# Altium footprint library GyokuRe.PcbLib: 1248 footprints (part 12 of 78)
Each footprint in its own frame and in the unit in brackets; x right, y up, seen from the top. Pads: shape width x height; smd on the part's side, far side on the other; paste and mask are expansions set on the pad; w line width, h text height; cw(c..) or ccw(c..) is an arc to the next point about the centre after c.
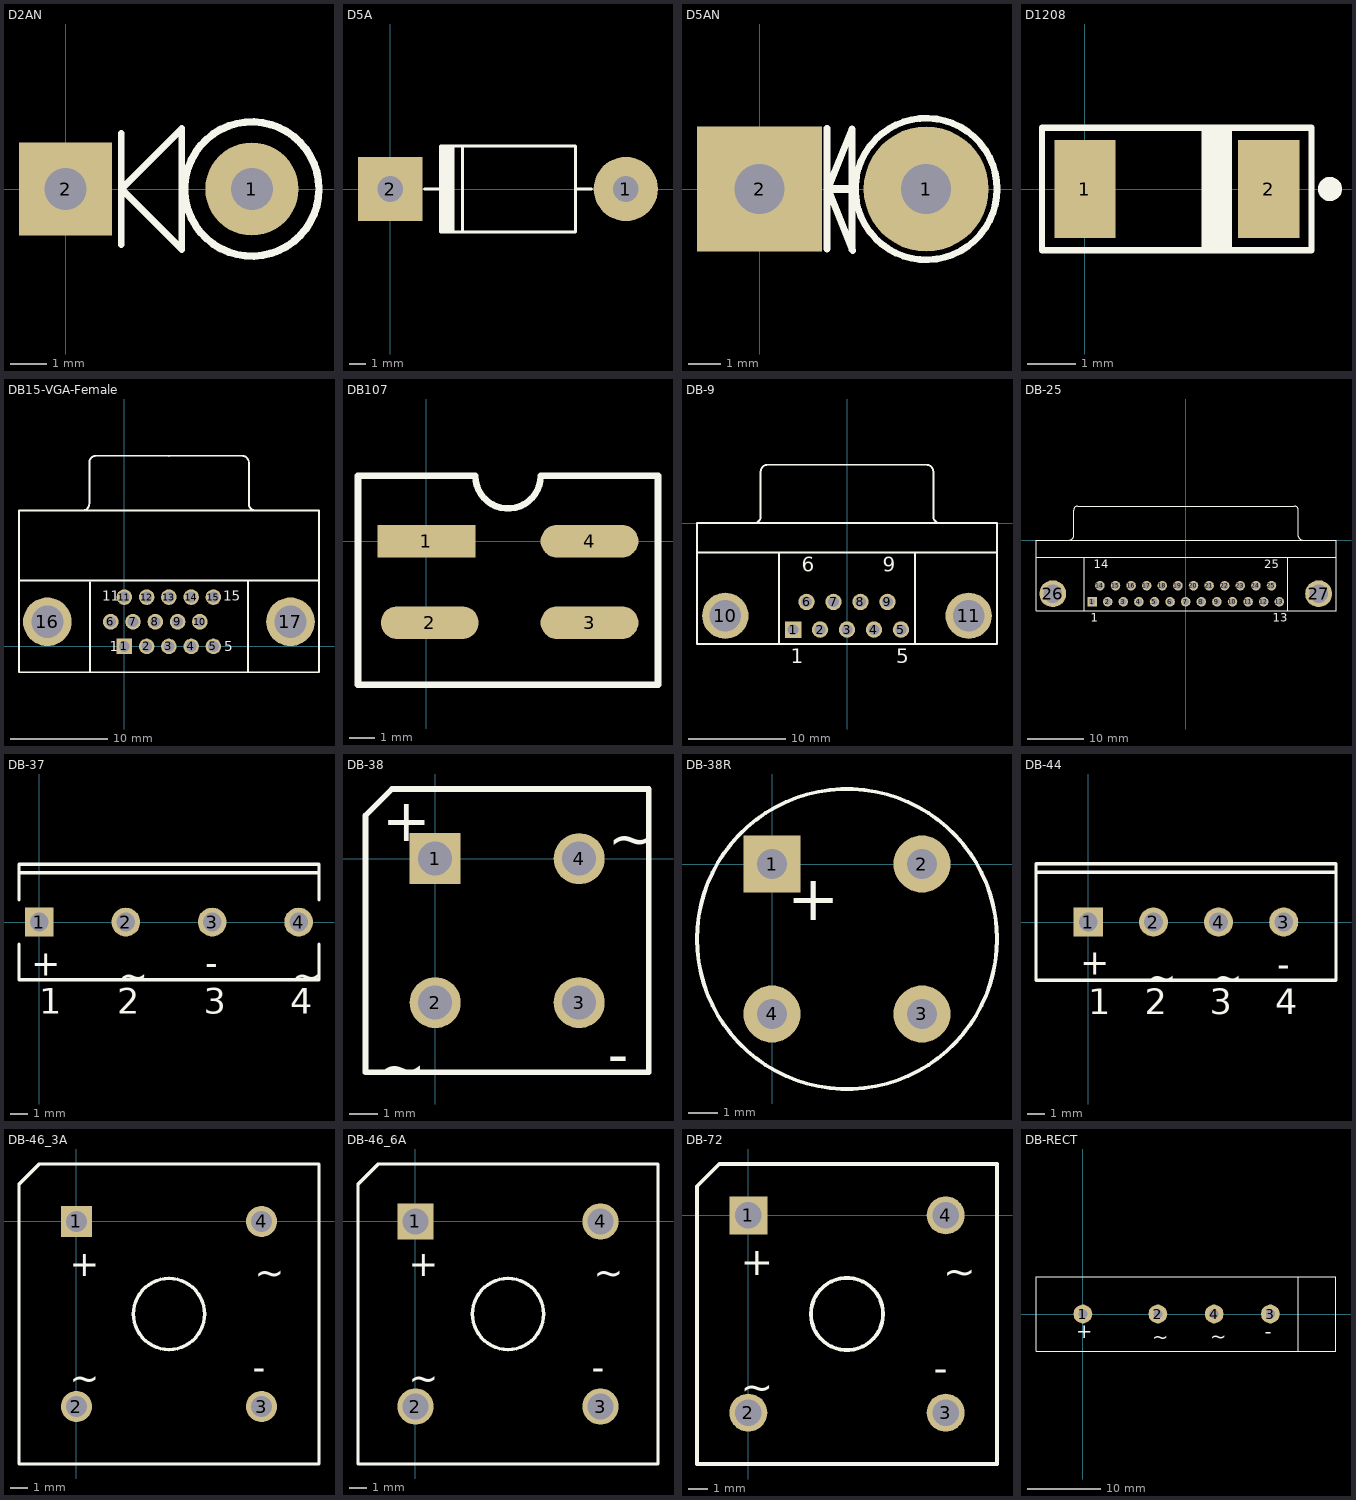
[diagram p11: the footprints below, top view; thin cyan lines are the x and y axes]

## D2AN [mil] "Diode 2A, W 150mil, L 450mil"
height 100
pads (2):
  round 100 hole 45: 1(200,0)
  rect 100x100 hole 45: 2(0,0)
Top Overlay:
  circle w8: c200,0 r72.11
  lines w7: 60,-60 60,60 ; 125,50 125,65 60,0 125,-65 125,55
3D body "SW3dPS-Zener 1W_Stand.STEP": height 252.32, standoff -78.14, extent 46.01,-49.99 214.01,55

## D5A [mil] "Diode 5A, W 200mil, L 550mil"
height 150
pads (2):
  round 150 hole 60: 1(550,0)
  rect 150x150 hole 60: 2(0,0)
Top Overlay:
  rectangle: 120,-100 150,100
  lines w7: 80,0 118,0 ; 118,-44 118,0 ; 118,46 118,0 ; 169,-99 169,100 ; 432,0 470,0 ; 118,-100 118,100 432,100 432,-100 118,-100
3D body "SW3dPS-BYW98.STEP": height 254.33, standoff -86.22, extent -51.87,-106 589.87,102.66

## D5AN [mil] "Diode 5A, W 200mil, L 250mil"
height 150
pads (2):
  round 150 hole 60: 1(200,0)
  rect 150x150 hole 60: 2(0,0)
Top Overlay:
  circle w8: c200,0 r85
  lines w8: 81,-72 81,73 ; 82,0 111,72 111,-73 ; 83,-2 112,-74
  lines w10: 82,0 113,0
3D body "SW3dPS-Zener 1W_Stand.STEP": height 252.32, standoff -78.14, extent 21,-73.99 189,31

## D1208 [mil]
pads (2):
  rect 50x80 smd: 1(0,0) 2(150,0)
Top Overlay:
  circle w9.84: c200.08,0 r4.92
  rectangle: 95,-50 120,50
  lines w5: -35,-50 -35,50 185,50 185,-50 -35,-50

## DB15-VGA-Female [mm] "7915 Series DSUB Right Angle VGA Female connector; Body Width, 30.81mm, 15 Positions"
pads (17):
  rect 1.6x1.6 hole 1.1: 1(0,0)
  round 1.6 hole 1.1: 2(2.29,0) 3(4.58,0) 4(6.87,0) 5(9.16,0) 6(-1.4,2.54) 7(0.89,2.54) 8(3.18,2.54) 9(5.47,2.54) 10(7.76,2.54) 11(0,5.08) 12(2.29,5.08) 13(4.58,5.08) 14(6.87,5.08) 15(9.16,5.08)
  round 5 hole 3.3: 16(-7.915,2.54) 17(17.075,2.54)
Top Overlay:
  lines w0.2: -10.83,6.77 20.01,6.77 ; -4.3,13.975 ccw(c-4.3,14.67) -3.605,14.67 -3.605,18.91 cw(c-2.91,18.91) -2.91,19.605 4.595,19.59 12.1,19.605 cw(c12.1,18.91) 12.795,18.91 12.795,14.67 ccw(c13.49,14.67) 13.49,13.975 ; -3.535,-2.65 -3.535,6.57 ; 12.725,-2.65 12.725,6.65 ; -10.83,-2.65 20.01,-2.65 20.01,13.97 -10.83,13.97 -10.83,-2.65
  text "1" at -1.524,-0.508 h1
  text "15" at 10.16,4.699 h1
  text "5" at 10.287,-0.508 h1
  text "11" at -2.286,4.699 h1

## DB107 [mil]
pads (4):
  rect 150x50 smd: 1(0,0)
  oval 150x50 smd: 2(5,-125) 3(250,-125) 4(250,0)
Top Overlay:
  lines w10: -105,-220 355,-220 355,100 175,100 cw(c125,100) 75,100 -105,100 -105,-220

## DB-9 [mm] "Connector; D Subminiature; 9 Position; Right Angle; Pitch 1.385 mm"
height 12.75
pads (11):
  rect 1.69x1.69 hole 1.09: 1(-5.54,-10.92)
  round 1.69 hole 1.09: 2(-2.77,-10.92) 3(0,-10.92) 4(2.77,-10.92) 5(5.54,-10.92) 6(-4.155,-8.08) 7(-1.385,-8.08) 8(1.385,-8.08) 9(4.155,-8.08)
  round 4.76 hole 3.26: 10(-12.495,-9.5) 11(12.495,-9.5)
Top Overlay:
  lines w0.2: -15.4,-3 15.4,-3 ; -9.56,0.005 ccw(c-9.56,0.7) -8.865,0.7 -8.865,5.3 ; -8.86,5.305 cw(c-8.165,5.305) -8.165,6 8.165,6 cw(c8.165,5.305) 8.86,5.305 ; -7,-12.4 -7,-3 ; 7,-12.4 7,-3 ; 8.865,5.3 8.865,0.7 ccw(c9.56,0.7) 9.56,0.005 ; -15.4,-12.4 15.4,-12.4 15.4,0 -15.4,0 -15.4,-12.4
  text "6" at -4.655,-4.975 h1.5
  text "9" at 3.655,-4.975 h1.5
  text "5" at 5.04,-14.375 h1.5
  text "1" at -5.79,-14.375 h1.5
3D body "D-Sub-L120584-Stig-Wahlstrom.STEP": height 3.34, standoff -12.96, extent -15.405,-12.473 15.405,8.227

## DB-25 [mm] "Connector; D Subminiature; 25 Position; Right Angle; Pitch 1.385 mm"
height 12.93
pads (27):
  rect 1.69x1.69 hole 1.09: 1(-16.566,-10.92)
  round 1.69 hole 1.09: 2(-13.805,-10.92) 3(-11.044,-10.92) 4(-8.283,-10.92) 5(-5.522,-10.92) 6(-2.761,-10.92) 7(0,-10.92) 8(2.761,-10.92) 9(5.522,-10.92) 10(8.283,-10.92) 11(11.044,-10.92) 12(13.805,-10.92) 13(16.566,-10.92) 14(-15.185,-8.08) 15(-12.424,-8.08) 16(-9.663,-8.08) 17(-6.902,-8.08) 18(-4.141,-8.08) 19(-1.38,-8.08) 20(1.381,-8.08) 21(4.142,-8.08) 22(6.903,-8.08) 23(9.664,-8.08) 24(12.425,-8.08) 25(15.186,-8.08)
  round 4.76 hole 3.26: 26(-23.526,-9.5) 27(23.526,-9.5)
Top Overlay:
  lines w0.2: -26.496,-3 26.604,-3 ; -20.541,0.005 ccw(c-20.541,0.7) -19.846,0.7 -19.846,5.3 ; -19.841,5.305 cw(c-19.146,5.305) -19.146,6 19.254,6 cw(c19.254,5.305) 19.949,5.305 ; -17.946,-12.5 -17.946,-3 ; 18.054,-12.5 18.054,-3 ; 19.954,5.3 19.954,0.7 ccw(c20.649,0.7) 20.649,0.005 ; -26.496,-12.5 -26.496,0 26.604,0 26.604,-12.5 -26.496,-12.5
  text "25" at 13.936,-4.975 h1.5
  text "14" at -16.31,-4.975 h1.5
  text "13" at 15.441,-14.475 h1.5
  text "1" at -16.816,-14.475 h1.5
3D body "D-Sub-L120575-Stig-Wahlstrom.STEP": height 3.37, standoff -12.93, extent -26.55,-12.473 26.55,8.227

## DB-37 [mm] "SIP; 4 Leads; Body 15 x 17.5 x 6.8 mm (typ); Pitch 5.1 mm"
height 15
pads (4):
  rect 1.7x1.7 hole 1.1: 1(0,0)
  round 1.7 hole 1.1: 2(5.1,0) 3(10.2,0) 4(15.3,0)
Top Overlay:
  lines w0.2: -1.2,-1.3 -1.2,-3.4 16.5,-3.4 16.5,-1.3 ; -1.2,1.3 -1.2,3.4 16.5,3.4 16.5,1.3 ; -1.2,2.9 16.5,2.9
  text "~" at 14.92,-3.9 h1.5
  text "~" at 4.68,-3.9 h1.5
  text "+" at -0.49,-3.16 h1.5
  text "-" at 9.78,-3.15 h1.5
  text "4" at 14.792,-5.4 h1.5
  text "3" at 9.692,-5.4 h1.5
  text "2" at 4.592,-5.4 h1.5
  text "1" at 0,-5.4 h1.5

## DB-38 [mm] "Bridge Rectifier; 4 Terminals; Body 9.4 x 9.4 mm (typ); Pitch 5.08 mm"
height 9.91
pads (4):
  rect 1.8x1.8 hole 1.2: 1(0,0)
  round 1.8 hole 1.2: 2(0,-5.08) 3(5.08,-5.08) 4(5.08,0)
Top Overlay:
  lines w0.2: -2.46,-7.54 7.54,-7.54 7.54,2.46 -1.524,2.46 -2.46,1.524 -2.46,-7.54
  text "~" at 6.096,0 h1.5
  text "~" at -2.032,-8.128 h1.5
  text "-" at 6.096,-7.62 h1.5
  text "+" at -1.87,0.624 h1.5

## DB-38R [mil] "Body round diam. 9mm"
pads (4):
  rect 76x76 hole 39.37 unplated: 1(0,0)
  round 76 hole 39.37 unplated: 2(200,0) 3(200,-200) 4(0,-200)
Top Overlay:
  circle w5: c100,-100 r200
  text "+" at 20,-75 h60.8
3D body: height 196.85, standoff 3.94, extent -100.39,-300.2 300.2,99.41
3D body: height 197.64, standoff 196.85, extent -30.51,-28.54 29.53,31.5
3D body: height 197.64, standoff 196.85, extent -19.68,-209.65 25.59,-193.9
3D body: height 197.64, standoff 196.85, extent 177.17,-8.86 222.44,6.89
3D body: height 197.64, standoff 196.85, extent 166.83,-199.68 223.92,-191.81

## DB-44 [mm] "SIP; 4 Leads; Body 15 x 17.5 x 6.8 mm (typ); Pitch 3.8 mm"
height 15
pads (4):
  rect 1.7x1.7 hole 1.1: 1(0,0)
  round 1.7 hole 1.1: 2(3.8,0) 3(11.4,0) 4(7.6,0)
Top Overlay:
  lines w0.2: -3.05,2.9 14.45,2.9 ; -3.05,-3.4 14.45,-3.4 14.45,3.4 -3.05,3.4 -3.05,-3.4
  text "-" at 11.02,-3.19 h1.5
  text "+" at -0.48,-3.08 h1.5
  text "~" at 7.3,-3.94 h1.5
  text "~" at 3.43,-3.94 h1.5
  text "1" at 0,-5.38 h1.5
  text "2" at 3.292,-5.38 h1.5
  text "3" at 7.092,-5.38 h1.5
  text "4" at 10.892,-5.38 h1.5

## DB-46_3A [mm] "Bridge Rectifier; 4 Terminals; Body 16.8 x 16.8 mm (typ); Pitch 10.67 mm"
height 6.35
pads (4):
  rect 1.8x1.8 hole 1.2: 1(0,0)
  round 1.8 hole 1.2: 2(0,-10.67) 3(10.67,-10.67) 4(10.67,0)
Top Overlay:
  circle w0.2: c5.335,-5.335 r2.05
  lines w0.2: -3.315,-13.985 -3.315,2.139 -2.139,3.315 13.985,3.315 13.985,-13.985 -3.315,-13.985
  text "+" at -0.388,-3.168 h1.5
  text "-" at 10.16,-9.144 h1.5
  text "~" at 10.28,-3.676 h1.5
  text "~" at -0.388,-9.772 h1.5

## DB-46_6A [mm] "Bridge Rectifier; 4 Terminals; Body 16.8 x 16.8 mm (typ); Pitch 10.67 mm"
height 6.35
pads (4):
  rect 2.1x2.1 hole 1.5: 1(0,0)
  round 2.1 hole 1.5: 2(0,-10.67) 3(10.67,-10.67) 4(10.67,0)
Top Overlay:
  circle w0.2: c5.335,-5.335 r2.05
  lines w0.2: -3.315,-13.985 13.985,-13.985 13.985,3.315 -2.139,3.315 -3.315,2.139 -3.315,-13.985
  text "~" at -0.388,-9.772 h1.5
  text "~" at 10.28,-3.676 h1.5
  text "-" at 10.16,-9.144 h1.5
  text "+" at -0.388,-3.168 h1.5

## DB-72 [mm] "Bridge Rectifier; 4 Terminals; Body 15.2 x 15.2 mm (typ); Pitch 10.4 mm"
height 5.34
pads (4):
  rect 2x2 hole 1.4: 1(0,0)
  round 2 hole 1.4: 2(0,-10.4) 3(10.4,-10.4) 4(10.4,0)
Top Overlay:
  circle w0.2: c5.2,-5.2 r1.9
  lines w0.2: -2.7,-13.1 -2.7,1.524 -1.524,2.7 13.1,2.7 13.1,-13.1 -2.7,-13.1
  text "+" at -0.388,-3.168 h1.5
  text "-" at 9.772,-8.756 h1.5
  text "~" at 10.28,-3.676 h1.5
  text "~" at -0.388,-9.772 h1.5

## DB-RECT [mm] "SIP Bridge rectifier - body 40x10 mm"
pads (4):
  round 2.54 hole 1.2: 1(0,0) 2(10.16,0) 3(25.4,0) 4(17.78,0)
Top Overlay:
  lines w0.127: 29.21,-5.08 29.21,5.08 ; -6.35,-5.08 34.29,-5.08 34.29,5.08 -6.35,5.08 -6.35,-5.08
  text "~" at 17.272,-3.937 h1.93
  text "~" at 9.398,-4.064 h1.93
  text "-" at 24.638,-3.302 h1.93
  text "+" at -0.889,-3.302 h1.93